# Altium footprint library NDLib.PCBLIB: 499 footprints (part 32 of 32)
Each footprint in its own frame and in the unit in brackets; x right, y up, seen from the top. Pads: shape width x height; smd on the part's side, far side on the other; paste and mask are expansions set on the pad; w line width, h text height; cw(c..) or ccw(c..) is an arc to the next point about the centre after c.
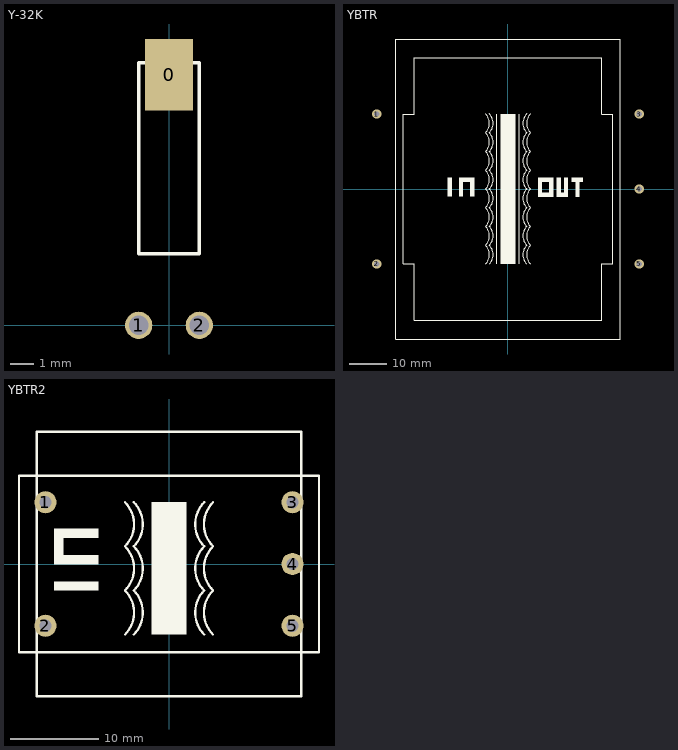
[diagram p31: the footprints below, top view; thin cyan lines are the x and y axes]

## Y-32K [mil]
pads (3):
  rect 78.74x118.11 smd: 0(0,413.39)
  round 45 hole 32: 1(-50,0) 2(50,0)
TopOverlay:
  lines w6: -50,118.11 -50,433.07 50,433.07 50,118.11 -50,118.11

## YBTR [mm] "淘宝永宝电子变压器"
height 0.508
pads (5):
  round 2.5 hole 1.4: 1(-35,20) 2(-35,-20) 3(35,20) 4(35,0) 5(35,-20)
TopOverlay:
  rectangle: -2,-20 2,20
  region: -16,3 -16,-2 -15,-2 -15,3
  region: -13,3 -13,-2 -12,-2 -12,2 -10,2 -10,-2 -9,-2 -9,3
  region: 17,3 17,2 18,2 18,-2 19,-2 19,2 20,2 20,3
  region: 13,3 13,-2 16,-2 16,3 15,3 15,-1 14,-1 14,3
  region: 8,3 8,-2 12,-2 12,-1 9,-1 9,2 11,2 11,-1 12,-1 12,3
  lines w0.254: -6,-20 ccw(c-8.5,-17.5) -6,-15 ccw(c-8.5,-12.5) -6,-10 ccw(c-8.5,-7.5) -6,-5 ccw(c-8.5,-2.5) -6,0 ccw(c-8.5,2.5) -6,5 ccw(c-8.5,7.5) -6,10 ccw(c-8.5,12.5) -6,15 ccw(c-8.5,17.5) -6,20 ; -5,-20 ccw(c-7.5,-17.5) -5,-15 ccw(c-7.5,-12.5) -5,-10 ccw(c-7.5,-7.5) -5,-5 ccw(c-7.5,-2.5) -5,0 ccw(c-7.5,2.5) -5,5 ccw(c-7.5,7.5) -5,10 ccw(c-7.5,12.5) -5,15 ccw(c-7.5,17.5) -5,20 ; -3,-20 -3,20 ; 3,-20 3,20 ; 5,-20 cw(c7.5,-17.5) 5,-15 cw(c7.5,-12.5) 5,-10 cw(c7.5,-7.5) 5,-5 cw(c7.5,-2.5) 5,0 cw(c7.5,2.5) 5,5 cw(c7.5,7.5) 5,10 cw(c7.5,12.5) 5,15 cw(c7.5,17.5) 5,20 ; 6,-20 cw(c8.5,-17.5) 6,-15 cw(c8.5,-12.5) 6,-10 cw(c8.5,-7.5) 6,-5 cw(c8.5,-2.5) 6,0 cw(c8.5,2.5) 6,5 cw(c8.5,7.5) 6,10 cw(c8.5,12.5) 6,15 cw(c8.5,17.5) 6,20 ; -30,-40 30,-40 30,40 -30,40 -30,-40 ; -28,-20 -25,-20 -25,-35 25,-35 25,-20 28,-20 28,20 25,20 25,35 -25,35 -25,20 -28,20 -28,-20

## YBTR2 [mm]
pads (5):
  round 2.5 hole 1.4: 1(-14,7) 2(-14,-7) 3(14,7) 4(14,0) 5(14,-7)
TopOverlay:
  rectangle: -2,-8 2,7
  region: -13,-3 -8,-3 -8,-2 -13,-2
  region: -13,0 -8,0 -8,1 -12,1 -12,3 -8,3 -8,4 -13,4
  lines w0.254: -5,-8 ccw(c-7.5,-5.5) -5,-3 ccw(c-7.5,-0.5) -5,2 ccw(c-7.5,4.5) -5,7 ; -4,-8 ccw(c-6.5,-5.5) -4,-3 ccw(c-6.5,-0.5) -4,2 ccw(c-6.5,4.5) -4,7 ; 4,-8 cw(c6.5,-5.5) 4,-3 cw(c6.5,-0.5) 4,2 cw(c6.5,4.5) 4,7 ; 5,-8 cw(c7.5,-5.5) 5,-3 cw(c7.5,-0.5) 5,2 cw(c7.5,4.5) 5,7 ; -17,-10 17,-10 17,10 -17,10 -17,-10 ; -15,-15 15,-15 15,15 -15,15 -15,-15